# Altium integrated library Download.IntLib: 186 symbols (continued)
## S25FL128S (continued)

## S25FL204k
designator U?, comment S25FLxxx
footprint SOP8 (SOIC, 8-Leads, Body 4.9x3.9mm, Pitch 1.27mm, IPC High Density)
pins: 1 CS, 2 SO/IO1, 3 ~{WP}/IO2, 4 VSS, 5 SI/IO0, 6 SCK, 7 ~{HOLD}/IO3, 8 VCC

## SHT10
designator S?, comment Sht10
footprint SHT10
pins: 1 GND, 2 DATA, 3 SCK, 4 VDD

## SIM800E
designator GSM?
footprint SIM800E
pins: 1 VBAT, 2 VBAT, 3 GND, 4 GND, 5 VDDEXIT, 6 PWRKEY, 7 DBG_RXD, 8 DBG_TXD, 9 RI, 10 DCD, 11 NETLIGHT, 12 STATUS, 13 DTR, 14 CTS, 15 RTS, 16 RXD, 17 TXD, 18 SIM_RST, 19 SIM_DATA, 20 SIM_CLK, 21 SIM_VDD, 22 GND, 23 RF_ANT, 24 GND

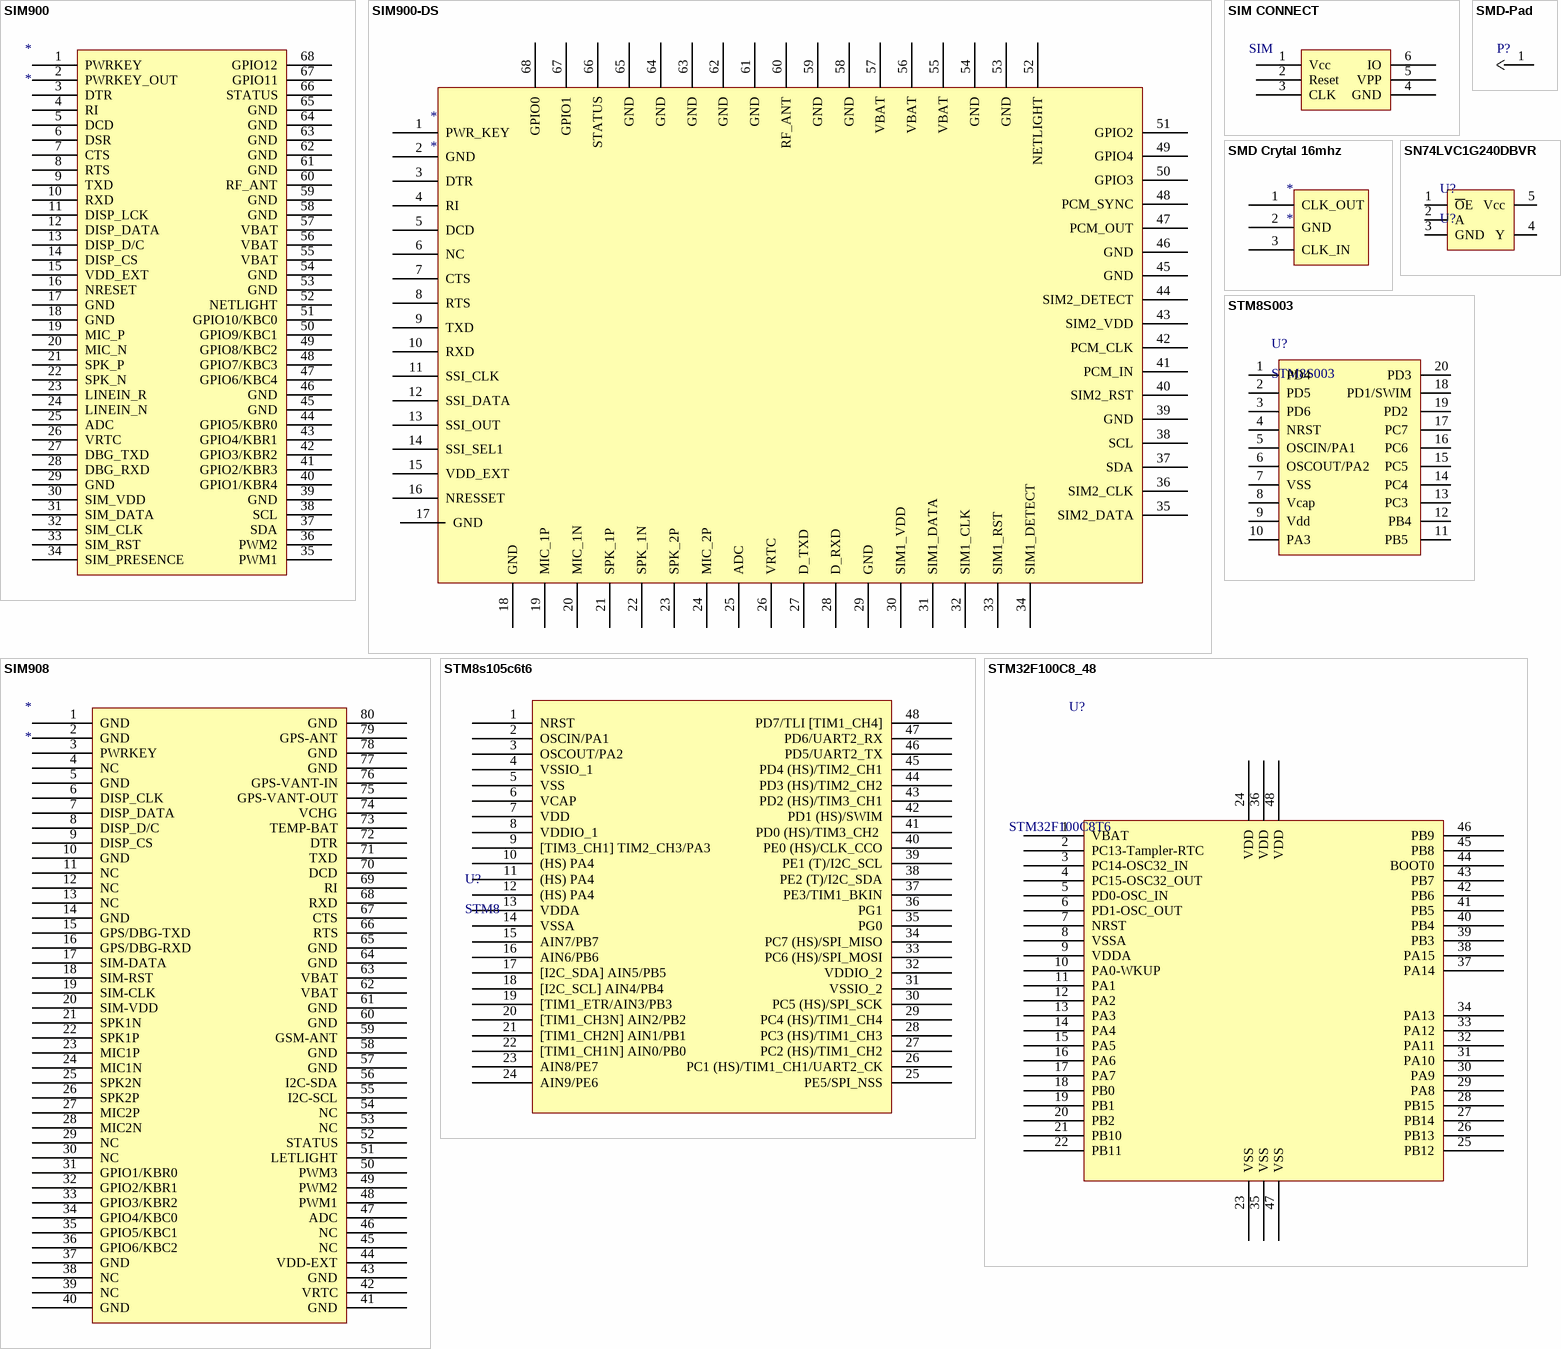
[diagram p5: symbols SIM900 to STM32F100C8_48]

## SIM900
designator *
footprint SIM900
pins: 1 PWRKEY, 2 PWRKEY_OUT, 3 DTR, 4 RI, 5 DCD, 6 DSR, 7 CTS, 8 RTS, 9 TXD, 10 RXD, 11 DISP_LCK, 12 DISP_DATA, 13 DISP_D/C, 14 DISP_CS, 15 VDD_EXT, 16 NRESET, 17 GND, 18 GND, 19 MIC_P, 20 MIC_N, 21 SPK_P, 22 SPK_N, 23 LINEIN_R, 24 LINEIN_N, 25 ADC, 26 VRTC, 27 DBG_TXD, 28 DBG_RXD, 29 GND, 30 SIM_VDD, 31 SIM_DATA, 32 SIM_CLK, 33 SIM_RST, 34 SIM_PRESENCE, 35 PWM1, 36 PWM2, 37 SDA, 38 SCL, 39 GND, 40 GPIO1/KBR4, 41 GPIO2/KBR3, 42 GPIO3/KBR2, 43 GPIO4/KBR1, 44 GPIO5/KBR0, 45 GND, 46 GND, 47 GPIO6/KBC4, 48 GPIO7/KBC3, 49 GPIO8/KBC2, 50 GPIO9/KBC1, 51 GPIO10/KBC0, 52 NETLIGHT, 53 GND, 54 GND, 55 VBAT, 56 VBAT, 57 VBAT, 58 GND, 59 GND, 60 RF_ANT, 61 GND, 62 GND, 63 GND, 64 GND, 65 GND, 66 STATUS, 67 GPIO11, 68 GPIO12

## SIM900-DS
designator *
footprint Quad68
pins: 1 PWR_KEY, 2 GND, 3 DTR, 4 RI, 5 DCD, 6 NC, 7 CTS, 8 RTS, 9 TXD, 10 RXD, 11 SSI_CLK, 12 SSI_DATA, 13 SSI_OUT, 14 SSI_SEL1, 15 VDD_EXT, 16 NRESSET, 17 GND, 18 GND, 19 MIC_1P, 20 MIC_1N, 21 SPK_1P, 22 SPK_1N, 23 SPK_2P, 24 MIC_2P, 25 ADC, 26 VRTC, 27 D_TXD, 28 D_RXD, 29 GND, 30 SIM1_VDD, 31 SIM1_DATA, 32 SIM1_CLK, 33 SIM1_RST, 34 SIM1_DETECT, 35 SIM2_DATA, 36 SIM2_CLK, 37 SDA, 38 SCL, 39 GND, 40 SIM2_RST, 41 PCM_IN, 42 PCM_CLK, 43 SIM2_VDD, 44 SIM2_DETECT, 45 GND, 46 GND, 47 PCM_OUT, 48 PCM_SYNC, 49 GPIO4, 50 GPIO3, 51 GPIO2, 52 NETLIGHT, 53 GND, 54 GND, 55 VBAT, 56 VBAT, 57 VBAT, 58 GND, 59 GND, 60 RF_ANT, 61 GND, 62 GND, 63 GND, 64 GND, 65 GND, 66 STATUS, 67 GPIO1, 68 GPIO0

## SIM908
designator *
footprint SIM908
pins: 1 GND, 2 GND, 3 PWRKEY, 4 NC, 5 GND, 6 DISP_CLK, 7 DISP_DATA, 8 DISP_D/C, 9 DISP_CS, 10 GND, 11 NC, 12 NC, 13 NC, 14 GND, 15 GPS/DBG-TXD, 16 GPS/DBG-RXD, 17 SIM-DATA, 18 SIM-RST, 19 SIM-CLK, 20 SIM-VDD, 21 SPK1N, 22 SPK1P, 23 MIC1P, 24 MIC1N, 25 SPK2N, 26 SPK2P, 27 MIC2P, 28 MIC2N, 29 NC, 30 NC, 31 GPIO1/KBR0, 32 GPIO2/KBR1, 33 GPIO3/KBR2, 34 GPIO4/KBC0, 35 GPIO5/KBC1, 36 GPIO6/KBC2, 37 GND, 38 NC, 39 NC, 40 GND, 41 GND, 42 VRTC, 43 GND, 44 VDD-EXT, 45 NC, 46 NC, 47 ADC, 48 PWM1, 49 PWM2, 50 PWM3, 51 LETLIGHT, 52 STATUS, 53 NC, 54 NC, 55 I2C-SCL, 56 I2C-SDA, 57 GND, 58 GND, 59 GSM-ANT, 60 GND, 61 GND, 62 VBAT, 63 VBAT, 64 GND, 65 GND, 66 RTS, 67 CTS, 68 RXD, 69 RI, 70 DCD, 71 TXD, 72 DTR, 73 TEMP-BAT, 74 VCHG, 75 GPS-VANT-OUT, 76 GPS-VANT-IN, 77 GND, 78 GND, 79 GPS-ANT, 80 GND

## SIM CONNECT
designator SIM  (value not drawn)
footprint SIM I9000
footprint SIMCARD
footprint SIM
pins: 1 Vcc, 2 Reset, 3 CLK, 4 GND, 5 VPP, 6 IO

## SMD Crytal 16mhz
designator *
footprint SMD3
pins: 1 CLK_OUT, 2 GND, 3 CLK_IN

## SMD-Pad
designator P?  (value not drawn)
footprint 1x3mm PAd
pins: 1 Pad

## SN74LVC1G240DBVR
designator U?, comment U?
footprint Sot23-5
pins: 1 ~{O}E, 2 A, 3 GND, 4 Y, 5 Vcc

## STM8S003
designator U?
footprint TSSOP20
pins: 1 PD4 "UART1_CK/TIM2_CH1/BEEP/(HS)", 2 PD5 "UART1_TX/AIN5/(HS)", 3 PD6 "UART1_RX/AIN6/(HS)", 4 NRST, 5 OSCIN/PA1 , 6 OSCOUT/PA2, 7 VSS, 8 Vcap, 9 Vdd, 10 PA3 "[SPI_NSS] TIM2_CH3/(HS)", 11 PB5  "(T)/I  2C_SDA [TIM1_BKIN]", 12 PB4 "(T)/I  2C_SCL [ADC_ETR]", 13 PC3  "(HS)/TIM1_CH3 [TLI] [TIM1_CH1N]", 14 PC4  "(HS)/TIM1_CH4/CLK_CCO/AIN2/[TIM1_CH2N]", 15 PC5  "(HS)/SPI_SCK [TIM2_CH1]", 16 PC6  "(HS)/SPI_MOSI [TIM1_CH1]", 17 PC7  "(HS)/SPI_MISO [TIM1_CH2]", 18 PD1/SWIM, 19 PD2  "(HS)/AIN3/[TIM2_CH3]", 20 PD3 "(HS)/AIN4/TIM2_CH2/ADC_ETR"

## STM8s105c6t6
designator U?, comment STM8
footprint STM32_48 (Thin QFP, 48-Leads, Body 7x7mm, Pitch 0.5mm, IPC High Density)
pins: 1 NRST, 2 OSCIN/PA1, 3 OSCOUT/PA2, 4 VSSIO_1, 5 VSS, 6 VCAP, 7 VDD, 8 VDDIO_1, 9 [TIM3_CH1] TIM2_CH3/PA3, 10 (HS) PA4, 11 (HS) PA4, 12 (HS) PA4, 13 VDDA, 14 VSSA, 15 AIN7/PB7, 16 AIN6/PB6, 17 [I2C_SDA] AIN5/PB5, 18 [I2C_SCL] AIN4/PB4, 19 [TIM1_ETR/AIN3/PB3, 20 [TIM1_CH3N] AIN2/PB2, 21 [TIM1_CH2N] AIN1/PB1, 22 [TIM1_CH1N] AIN0/PB0, 23 AIN8/PE7, 24 AIN9/PE6, 25 PE5/SPI_NSS, 26 PC1 (HS)/TIM1_CH1/UART2_CK, 27 PC2 (HS)/TIM1_CH2, 28 PC3 (HS)/TIM1_CH3, 29 PC4 (HS)/TIM1_CH4, 30 PC5 (HS)/SPI_SCK, 31 VSSIO_2, 32 VDDIO_2, 33 PC6 (HS)/SPI_MOSI, 34 PC7 (HS)/SPI_MISO, 35 PG0, 36 PG1, 37 PE3/TIM1_BKIN, 38 PE2 (T)/I2C_SDA, 39 PE1 (T)/I2C_SCL, 40 PE0 (HS)/CLK_CCO, 41 PD0 (HS)/TIM3_CH2 , 42 PD1 (HS)/SWIM, 43 PD2 (HS)/TIM3_CH1, 44 PD3 (HS)/TIM2_CH2, 45 PD4 (HS)/TIM2_CH1, 46 PD5/UART2_TX, 47 PD6/UART2_RX, 48 PD7/TLI [TIM1_CH4]

## STM32F100C8_48
designator U?, comment STM32F100C8T6
footprint STM32_48 (Thin QFP, 48-Leads, Body 7x7mm, Pitch 0.5mm, IPC High Density)
pins: 1 VBAT, 2 PC13-Tampler-RTC, 3 PC14-OSC32_IN, 4 PC15-OSC32_OUT, 5 PD0-OSC_IN, 6 PD1-OSC_OUT, 7 NRST, 8 VSSA, 9 VDDA, 10 PA0-WKUP, 11 PA1, 12 PA2, 13 PA3, 14 PA4, 15 PA5, 16 PA6, 17 PA7, 18 PB0, 19 PB1, 20 PB2, 21 PB10, 22 PB11, 23 VSS, 24 VDD, 25 PB12, 26 PB13, 27 PB14, 28 PB15, 29 PA8, 30 PA9, 31 PA10, 32 PA11, 33 PA12, 34 PA13, 35 VSS, 36 VDD, 37 PA14, 38 PA15, 39 PB3, 40 PB4, 41 PB5, 42 PB6, 43 PB7, 44 BOOT0, 45 PB8, 46 PB9, 47 VSS, 48 VDD

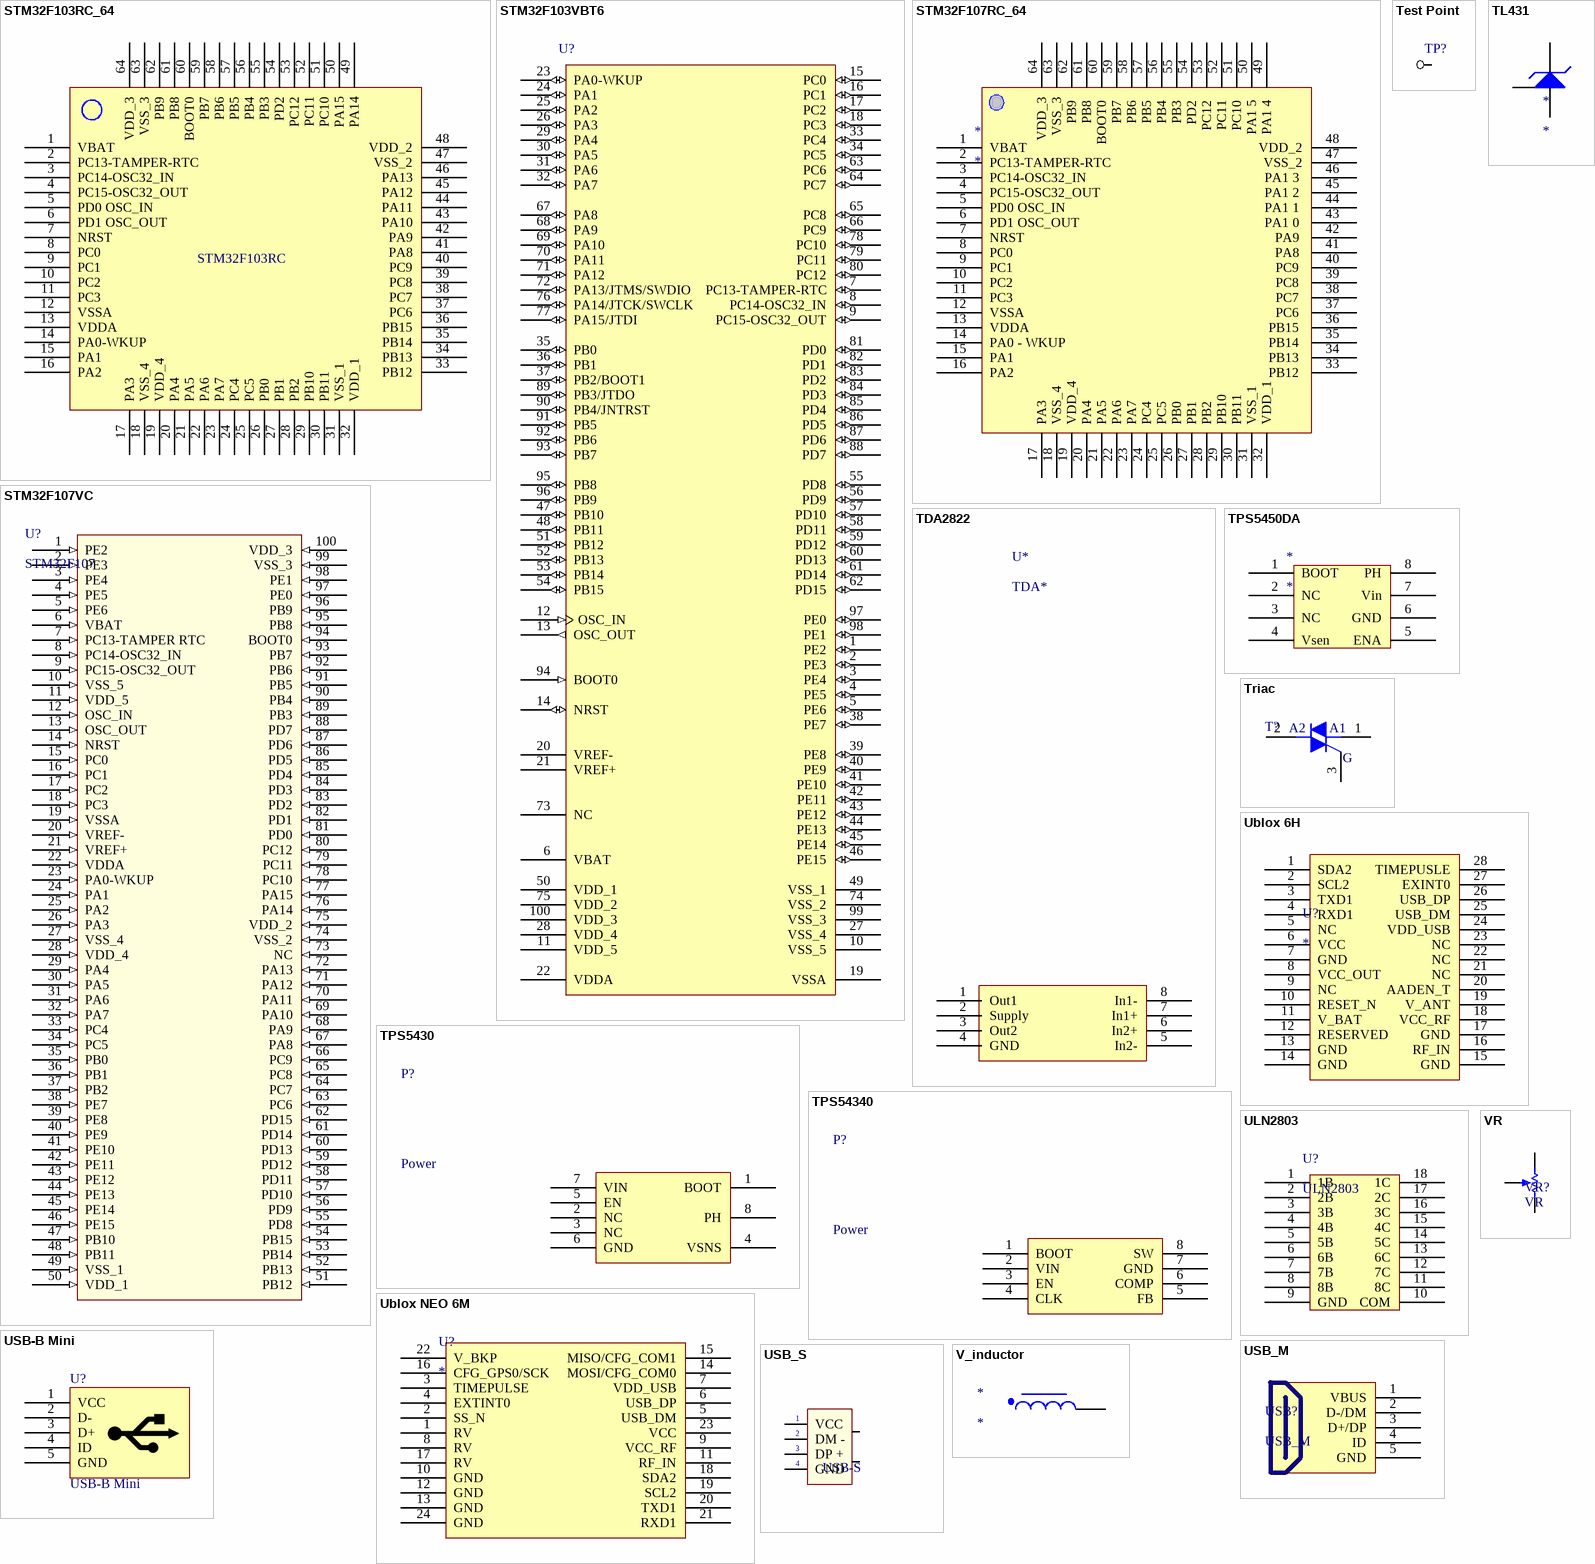
[diagram p6: symbols STM32F103RC_64 to VR]

## STM32F103RC_64
designator U?  (value not drawn)
footprint STM32_64
pins: 1 VBAT, 2 PC13-TAMPER-RTC, 3 PC14-OSC32_IN, 4 PC15-OSC32_OUT, 5 PD0 OSC_IN, 6 PD1 OSC_OUT, 7 NRST, 8 PC0, 9 PC1, 10 PC2, 11 PC3, 12 VSSA, 13 VDDA, 14 PA0-WKUP, 15 PA1, 16 PA2, 17 PA3, 18 VSS_4, 19 VDD_4, 20 PA4, 21 PA5, 22 PA6, 23 PA7, 24 PC4, 25 PC5, 26 PB0, 27 PB1, 28 PB2, 29 PB10, 30 PB11, 31 VSS_1, 32 VDD_1, 33 PB12, 34 PB13, 35 PB14, 36 PB15, 37 PC6, 38 PC7, 39 PC8, 40 PC9, 41 PA8, 42 PA9, 43 PA10, 44 PA11, 45 PA12, 46 PA13, 47 VSS_2, 48 VDD_2, 49 PA14, 50 PA15, 51 PC10, 52 PC11, 53 PC12, 54 PD2, 55 PB3, 56 PB4, 57 PB5, 58 PB6, 59 PB7, 60 BOOT0, 61 PB8, 62 PB9, 63 VSS_3, 64 VDD_3
text: STM32F103RC

## STM32F103VBT6
designator U?
STM32 ARM-based 32-bit MCU with 64 Kbytes Flash, 100-pin LQFP, Industrial Temperature; Published: 30-May-2008; DatasheetVersion: rev6, Mar-2008; PackageVersion: Mar-2008; PackageReference: LQFP100; Publisher: Altium Limited; PackageDescription: 100-Pin Low-Profile Quad Flat Pack, 14 x 14 mm Body, 0.5 mm Pitch (LQFP100); ComponentLink1Description: Manufacturer Link; ComponentLink1URL: www.st.com/stm32; ComponentLink2Description: Datasheet; ComponentLink2URL: http://www.st.com/stonline/products/literature/ds/13587.pdf
footprint LQFP100_M (Thin QFP, 100-Leads, Body 14x14mm, Pitch 0.5mm, IPC Low Density)
pins: 1 PE2 (io), 2 PE3 (io), 3 PE4 (io), 4 PE5 (io), 5 PE6 (io), 6 VBAT (power), 7 PC13-TAMPER-RTC (io), 8 PC14-OSC32_IN (io), 9 PC15-OSC32_OUT (io), 10 VSS_5 (power), 11 VDD_5 (power), 12 OSC_IN (in), 13 OSC_OUT (out), 14 NRST (io), 15 PC0 (io), 16 PC1 (io), 17 PC2 (io), 18 PC3 (io), 19 VSSA (power), 20 VREF- (power), 21 VREF+ (power), 22 VDDA (power), 23 PA0-WKUP (io), 24 PA1 (io), 25 PA2 (io), 26 PA3 (io), 27 VSS_4 (power), 28 VDD_4 (power), 29 PA4 (io), 30 PA5 (io), 31 PA6 (io), 32 PA7 (io), 33 PC4 (io), 34 PC5 (io), 35 PB0 (io), 36 PB1 (io), 37 PB2/BOOT1 (io), 38 PE7 (io), 39 PE8 (io), 40 PE9 (io), 41 PE10 (io), 42 PE11 (io), 43 PE12 (io), 44 PE13 (io), 45 PE14 (io), 46 PE15 (io), 47 PB10 (io), 48 PB11 (io), 49 VSS_1 (power), 50 VDD_1 (power), 51 PB12 (io), 52 PB13 (io), 53 PB14 (io), 54 PB15 (io), 55 PD8 (io), 56 PD9 (io), 57 PD10 (io), 58 PD11 (io), 59 PD12 (io), 60 PD13 (io), 61 PD14 (io), 62 PD15 (io), 63 PC6 (io), 64 PC7 (io), 65 PC8 (io), 66 PC9 (io), 67 PA8 (io), 68 PA9 (io), 69 PA10 (io), 70 PA11 (io), 71 PA12 (io), 72 PA13/JTMS/SWDIO (io), 73 NC, 74 VSS_2 (power), 75 VDD_2 (power), 76 PA14/JTCK/SWCLK (io), 77 PA15/JTDI (io), 78 PC10 (io), 79 PC11 (io), 80 PC12 (io), 81 PD0 (io), 82 PD1 (io), 83 PD2 (io), 84 PD3 (io), 85 PD4 (io), 86 PD5 (io), 87 PD6 (io), 88 PD7 (io), 89 PB3/JTDO (io), 90 PB4/JNTRST (io), 91 PB5 (io), 92 PB6 (io), 93 PB7 (io), 94 BOOT0 (in), 95 PB8 (io), 96 PB9 (io), 97 PE0 (io), 98 PE1 (io), 99 VSS_3 (power), 100 VDD_3 (power)

## STM32F107RC_64
designator *
footprint STM32_64
pins: 1 VBAT, 2 PC13-TAMPER-RTC, 3 PC14-OSC32_IN, 4 PC15-OSC32_OUT, 5 PD0 OSC_IN, 6 PD1 OSC_OUT, 7 NRST, 8 PC0, 9 PC1, 10 PC2, 11 PC3, 12 VSSA, 13 VDDA, 14 PA0 - WKUP, 15 PA1, 16 PA2, 17 PA3, 18 VSS_4, 19 VDD_4, 20 PA4, 21 PA5, 22 PA6, 23 PA7, 24 PC4, 25 PC5, 26 PB0, 27 PB1, 28 PB2, 29 PB10, 30 PB11, 31 VSS_1, 32 VDD_1, 33 PB12 , 34 PB13 , 35 PB14 , 36 PB15 , 37 PC6 , 38 PC7 , 39 PC8 , 40 PC9 , 41 PA8 , 42 PA9 , 43 PA1 0 , 44 PA1 1 , 45 PA1 2 , 46 PA1 3 , 47 VSS_2, 48 VDD_2, 49 PA1 4 , 50 PA1 5 , 51 PC10 , 52 PC11 , 53 PC12 , 54 PD2 , 55 PB3 , 56 PB4 , 57 PB5 , 58 PB6 , 59 PB7 , 60 BOOT0 , 61 PB8 , 62 PB9 , 63 VSS_3, 64 VDD_3
3 alternate drawings of the same symbol

## STM32F107VC
designator U?, comment STM32F107
footprint LQFP100_M (Thin QFP, 100-Leads, Body 14x14mm, Pitch 0.5mm, IPC Low Density)
pins: 1 PE2 (in), 2 PE3 (in), 3 PE4 (in), 4 PE5 (in), 5 PE6 (in), 6 VBAT (in), 7 PC13-TAMPER RTC (in), 8 PC14-OSC32_IN (in), 9 PC15-OSC32_OUT (in), 10 VSS_5 (in), 11 VDD_5 (in), 12 OSC_IN (in), 13 OSC_OUT (in), 14 NRST (in), 15 PC0 (in), 16 PC1 (in), 17 PC2 (in), 18 PC3 (in), 19 VSSA (in), 20 VREF- (in), 21 VREF+ (in), 22 VDDA (in), 23 PA0-WKUP (in), 24 PA1 (in), 25 PA2 (in), 26 PA3 (in), 27 VSS_4 (in), 28 VDD_4 (in), 29 PA4 (in), 30 PA5 (in), 31 PA6 (in), 32 PA7 (in), 33 PC4 (in), 34 PC5 (in), 35 PB0 (in), 36 PB1 (in), 37 PB2 (in), 38 PE7 (in), 39 PE8 (in), 40 PE9 (in), 41 PE10 (in), 42 PE11 (in), 43 PE12 (in), 44 PE13 (in), 45 PE14 (in), 46 PE15 (in), 47 PB10 (in), 48 PB11 (in), 49 VSS_1 (in), 50 VDD_1 (in), 51 PB12 (in), 52 PB13 (in), 53 PB14 (in), 54 PB15 (in), 55 PD8 (in), 56 PD9 (in), 57 PD10 (in), 58 PD11 (in), 59 PD12 (in), 60 PD13 (in), 61 PD14 (in), 62 PD15 (in), 63 PC6 (in), 64 PC7 (in), 65 PC8 (in), 66 PC9 (in), 67 PA8 (in), 68 PA9 (in), 69 PA10 (in), 70 PA11 (in), 71 PA12 (in), 72 PA13 (in), 73 NC (in), 74 VSS_2 (in), 75 VDD_2 (in), 76 PA14 (in), 77 PA15 (in), 78 PC10 (in), 79 PC11 (in), 80 PC12 (in), 81 PD0 (in), 82 PD1 (in), 83 PD2 (in), 84 PD3 (in), 85 PD4 (in), 86 PD5 (in), 87 PD6 (in), 88 PD7 (in), 89 PB3 (in), 90 PB4 (in), 91 PB5 (in), 92 PB6 (in), 93 PB7 (in), 94 BOOT0 (in), 95 PB8 (in), 96 PB9 (in), 97 PE0 (in), 98 PE1 (in), 99 VSS_3 (in), 100 VDD_3 (in)

## TDA2822
designator U*, comment TDA*
footprint SOP8 (SOIC, 8-Leads, Body 4.9x3.9mm, Pitch 1.27mm, IPC High Density)
pins: 1 Out1, 2 Supply, 3 Out2, 4 GND, 5 In2-, 6 In2+, 7 In1+, 8 In1-

## Test Point
designator TP?
footprint TP (Test point 0.8mm)
pins: 1

## TL431
designator *
footprint TO-92(3)
pins: 1 Vref, 2 K, 3 A

## TPS5430
designator P?, comment Power
footprint SOP8 (SOIC, 8-Leads, Body 4.9x3.9mm, Pitch 1.27mm, IPC High Density)
pins: 1 BOOT, 2 NC, 3 NC, 4 VSNS, 5 EN, 6 GND, 7 VIN, 8 PH

## TPS5450DA
designator *
footprint SOP8 (SOIC, 8-Leads, Body 4.9x3.9mm, Pitch 1.27mm, IPC High Density)
pins: 1 BOOT, 2 NC, 3 NC, 4 Vsen, 5 ENA, 6 GND, 7 Vin, 8 PH

## TPS54340
designator P?, comment Power
footprint SOP8 (SOIC, 8-Leads, Body 4.9x3.9mm, Pitch 1.27mm, IPC High Density)
pins: 1 BOOT, 2 VIN, 3 EN, 4 CLK, 5 FB, 6 COMP, 7 GND, 8 SW

## Triac
designator T?  (value not drawn)
Silicon Bidirectional Triode Thyristor; Note: Pin 2 is electrically connected to Pin 4 (TAB); Published: 29-Sep-2000; LatestRevisionDate: 17-Jul-2002; LatestRevisionNote: Re-released for DXP Platform.; DatasheetVersion: 1999; PackageReference: 369-03; Publisher: Altium Limited; PackageDescription: TO, Thru-Hole, Vertical, Heatsink Mounted; 3 In-Line Leads; Pitch 2.28 mm; ComponentLink1Description: Manufacturer Link; ComponentLink1URL: http://www.motorola.com/
footprint QTO-220H1 (TO-220 - 1-2-3)
footprint D2-PAK
pins: 1, 2 M2, 3 G
text: A2; A1

## Ublox 6H
designator U?
pins: 1 SDA2, 2 SCL2, 3 TXD1, 4 RXD1, 5 NC, 6 VCC, 7 GND, 8 VCC_OUT, 9 NC, 10 RESET_N, 11 V_BAT, 12 RESERVED, 13 GND, 14 GND, 15 GND, 16 RF_IN, 17 GND, 18 VCC_RF, 19 V_ANT, 20 AADEN_T, 21 NC, 22 NC, 23 NC, 24 VDD_USB, 25 USB_DM, 26 USB_DP, 27 EXINT0, 28 TIMEPUSLE

## Ublox NEO 6M
designator U?
footprint Neo 6M
pins: 1 RV, 2 SS_N, 3 TIMEPULSE, 4 EXTINT0, 5 USB_DM, 6 USB_DP, 7 VDD_USB, 8 RV, 9 VCC_RF, 10 GND, 11 RF_IN, 12 GND, 13 GND, 14 MOSI/CFG_COM0, 15 MISO/CFG_COM1, 16 CFG_GPS0/SCK, 17 RV, 18 SDA2, 19 SCL2, 20 TXD1, 21 RXD1, 22 V_BKP, 23 VCC, 24 GND

## ULN2803
designator U?
footprint SOIC18
pins: 1 1B, 2 2B, 3 3B, 4 4B, 5 5B, 6 6B, 7 7B, 8 8B, 9 GND, 10 COM, 11 8C, 12 7C, 13 6C, 14 5C, 15 4C, 16 3C, 17 2C, 18 1C

## USB-B Mini
designator U?
CONN USB MINI B R/A SMD; Manufacturer: On Shore Technology Inc; Manufacturer Part Number: USB-M26FTR; Digi-Key Part Number: ED2992TR-ND; Unit Price: 0.49140
footprint USB-B Mini
footprint USB_B_MINI_SMD
pins: 1 VCC, 2 D-, 3 D+, 4 ID, 5 GND

## USB_M
designator USB?
footprint USB_MICRO_SMD
footprint USB-B Micro- vertical
pins: 1 VBUS, 2 D-/DM, 3 D+/DP, 4 ID, 5 GND

## USB_S
designator USB?, comment USB-S
USB connector; Value: USB
footprint USB_B (USB A connector, 4pin, For USB sing)
pins: 1 VCC, 2 DM -, 3 DP +, 4 GND, 5, 6

## V_inductor
designator *
footprint LQFP48_L (Thin QFP, 48-Leads, Body 7x7mm, Pitch 0.5mm, IPC High Density)
pins: 2

## VR
designator VR?
Potentiometer; Sim Note: Enter the Resistance value and the set point into parameter fields.; Set Position: 0.5; Published: 8-Jun-2000; LatestRevisionDate: 17-Jul-2002; LatestRevisionNote: Re-released for DXP Platform.; PackageReference: VR5; Publisher: Altium Limited; PackageDescription: Variable Resistor, Thru-Hole; 3 Leads
footprint VR (Resistor Variable)
footprint VR1 (Variable Resistor)
pins: 1 TOP, 2 BOT, 3 TAP
1 alternate drawing of the same symbol

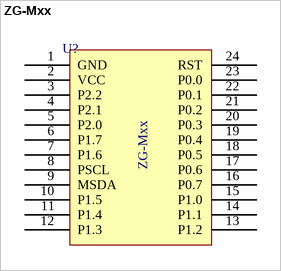
[diagram p7: symbol ZG-Mxx]

## ZG-Mxx
designator U?  (value not drawn)
Zigbee Module
footprint ZG-Mxx
pins: 1 GND, 2 VCC, 3 P2.2, 4 P2.1, 5 P2.0, 6 P1.7, 7 P1.6, 8 PSCL, 9 MSDA, 10 P1.5, 11 P1.4, 12 P1.3, 13 P1.2, 14 P1.1, 15 P1.0, 16 P0.7, 17 P0.6, 18 P0.5, 19 P0.4, 20 P0.3, 21 P0.2, 22 P0.1, 23 P0.0, 24 RST